# Altium footprint library AMA4B_adapter_board.PcbLib: 84 footprints (part 6 of 6)
Each footprint in its own frame and in the unit in brackets; x right, y up, seen from the top. Pads: shape width x height; smd on the part's side, far side on the other; paste and mask are expansions set on the pad; w line width, h text height; cw(c..) or ccw(c..) is an arc to the next point about the centre after c.
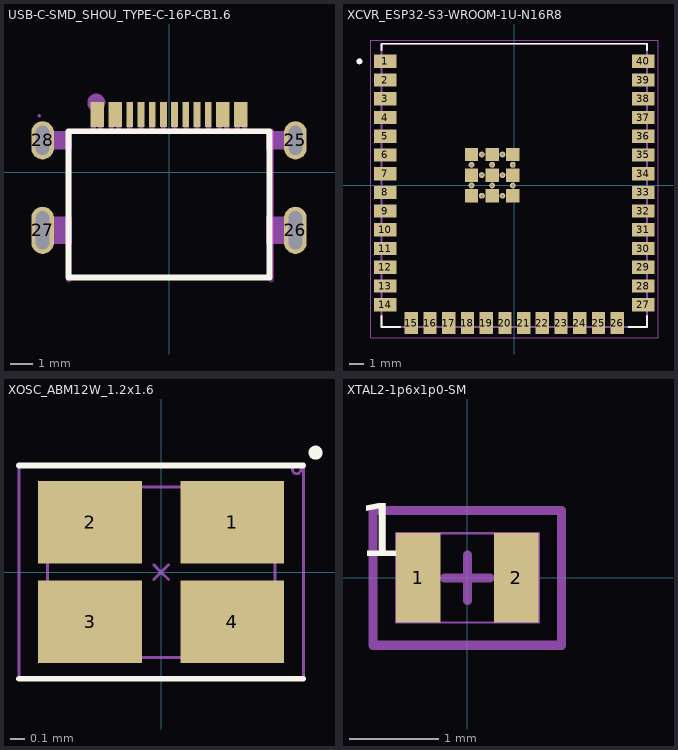
[diagram p5: the footprints below, top view; thin cyan lines are the x and y axes]

## USB-C-SMD_SHOU_TYPE-C-16P-CB1.6 [mm]
pads (20):
  oval 1x1.7 hole 0.6 slot 1.3 at 90 deg paste+0 mask+0.05: 25(5.62,1.425) 28(-5.62,1.425)
  oval 1x2.1 hole 0.6 slot 1.7 at 90 deg paste+0 mask+0.05: 26(5.62,-2.575) 27(-5.62,-2.575)
  rect 0.3x1.1 smd paste-100 mask+0.05: A1(-3.35,2.575) A4(-2.55,2.575) A5(-1.25,2.575) A6(-0.25,2.575) A7(0.25,2.575) A8(1.25,2.575) A9(2.55,2.575) A12(3.35,2.575) B1(3.05,2.575) B4(2.25,2.575) B5(1.75,2.575) B6(0.75,2.575) B7(-0.75,2.575) B8(-1.75,2.575) B9(-2.25,2.575) B12(-3.05,2.575)
Top Overlay:
  lines w0.254: -4.47,-4.675 -4.47,1.825 4.47,1.825 4.47,-4.675 -4.47,-4.675
Top Paste:
  drawing of 16 lines, arcs and shapes, not listed
Keep-Out Layer:
  lines w0.254: -4.451,1.824 4.549,1.824 ; -4.451,1.824 -4.451,-4.776 -4.451,1.824 ; -4.451,1.824 4.549,1.824 ; 4.549,1.824 4.549,-4.776 4.549,1.824 ; 4.549,1.824 4.549,1.824 ; 4.549,1.824 4.549,1.824
Mechanical 6:
  circle w0.4: c-3.232,3.101 r0.2
Top Courtyard:
  region: -5.71,2.524 -5.71,2.549 -5.745,2.584 -5.795,2.584 -5.83,2.549 -5.83,2.524 -5.83,2.499 -5.795,2.464 -5.745,2.464 -5.71,2.499 -5.71,2.524
  region: -3.45,2.524 -3.25,2.524 -3.25,1.724 -3.45,1.724
  region: -3.15,2.524 -2.95,2.524 -2.95,1.724 -3.15,1.724
  region: -2.65,2.524 -2.45,2.524 -2.45,1.724 -2.65,1.724
  region: -2.35,2.524 -2.15,2.524 -2.15,1.724 -2.35,1.724
  region: -1.85,2.524 -1.65,2.524 -1.65,1.724 -1.85,1.724
  region: -1.35,2.524 -1.15,2.524 -1.15,1.724 -1.35,1.724
  region: -0.85,2.524 -0.65,2.524 -0.65,1.724 -0.85,1.724
  region: -0.35,2.524 -0.15,2.524 -0.15,1.724 -0.35,1.724
  region: 0.15,2.524 0.35,2.524 0.35,1.724 0.15,1.724
  region: 0.65,2.524 0.85,2.524 0.85,1.724 0.65,1.724
  region: 1.15,2.524 1.35,2.524 1.35,1.724 1.15,1.724
  region: 1.65,2.524 1.85,2.524 1.85,1.724 1.65,1.724
  region: 2.15,2.524 2.35,2.524 2.35,1.724 2.15,1.724
  region: 2.45,2.524 2.65,2.524 2.65,1.724 2.45,1.724
  region: 2.95,2.524 3.15,2.524 3.15,1.724 2.95,1.724
  region: 3.25,2.524 3.45,2.524 3.45,1.724 3.25,1.724
  region: -5.77,1.825 -5.47,1.825 -5.47,1.025 -5.77,1.025
  region: 5.47,1.825 5.77,1.825 5.77,1.025 5.47,1.025
  region: -5.77,-1.975 -5.47,-1.975 -5.47,-3.175 -5.77,-3.175
  region: 5.47,-1.975 5.77,-1.975 5.77,-3.175 5.47,-3.175
  region: -4.315,1.02 -5.765,1.02 -5.765,1.82 -4.315,1.82
  region: -4.315,-3.17 -5.765,-3.17 -5.765,-1.97 -4.315,-1.97
  region: 5.775,1.02 4.325,1.02 4.325,1.82 5.775,1.82
  region: 5.77,-3.18 4.32,-3.18 4.32,-1.98 5.77,-1.98
  lines w0.051: -4.47,-4.676 -4.47,1.824 4.47,1.824 4.47,-4.676 -4.47,-4.676
3D body "tT7W-USB1.step": height 1.56, standoff -1.6, extent -5.77,-4.675 5.77,2.525

## XCVR_ESP32-S3-WROOM-1U-N16R8 [mm]
height 3.35
pads (61):
  rect 1.5x0.9 smd: 1(-8.75,8.41) 2(-8.75,7.14) 3(-8.75,5.87) 4(-8.75,4.6) 5(-8.75,3.33) 6(-8.75,2.06) 7(-8.75,0.79) 8(-8.75,-0.48) 9(-8.75,-1.75) 10(-8.75,-3.02) 11(-8.75,-4.29) 12(-8.75,-5.56) 13(-8.75,-6.83) 14(-8.75,-8.1) 27(8.75,-8.1) 28(8.75,-6.83) 29(8.75,-5.56) 30(8.75,-4.29) 31(8.75,-3.02) 32(8.75,-1.75) 33(8.75,-0.48) 34(8.75,0.79) 35(8.75,2.06) 36(8.75,3.33) 37(8.75,4.6) 38(8.75,5.87) 39(8.75,7.14) 40(8.75,8.41)
  rect 0.9x1.5 smd: 15(-6.985,-9.35) 16(-5.715,-9.35) 17(-4.445,-9.35) 18(-3.175,-9.35) 19(-1.905,-9.35) 20(-0.635,-9.35) 21(0.635,-9.35) 22(1.905,-9.35) 23(3.175,-9.35) 24(4.445,-9.35) 25(5.715,-9.35) 26(6.985,-9.35)
  rect 0.9x0.9 smd: 41_1(-2.9,2.09) 41_2(-1.5,2.09) 41_3(-0.1,2.09) 41_4(-2.9,0.69) 41_5(-1.5,0.69) 41_6(-0.1,0.69) 41_7(-2.9,-0.71) 41_8(-1.5,-0.71) 41_9(-0.1,-0.71)
  round 0.4 hole 0.2 mask+0: 41_10(-2.2,2.09) 41_11(-0.8,2.09) 41_12(-2.9,1.39) 41_13(-1.5,1.39) 41_14(-0.1,1.39) 41_15(-2.2,0.69) 41_16(-0.8,0.69) 41_17(-2.9,-0.01) 41_18(-1.5,-0.01) 41_19(-0.1,-0.01) 41_20(-2.2,-0.71) 41_21(-0.8,-0.71)
Top Overlay:
  circle w0.2: c-10.5,8.41 r0.1
  lines w0.127: -9,-8.87 -9,-9.6 -7.755,-9.6 ; -9,9.18 -9,9.6 9,9.6 9,9.18 ; 7.755,-9.6 9,-9.6 9,-8.87
Top 3D Body:
  circle w0.2: c-10.5,8.41 r0.1
  lines w0.127: -9,-9.6 -9,9.6 9,9.6 9,-9.6 -9,-9.6
Top Courtyard:
  lines w0.05: -9.75,-10.35 9.75,-10.35 9.75,9.85 -9.75,9.85 -9.75,-10.35
3D body "step_temp.STEP": height 3.35, standoff 0, extent -9,-9.6 9,9.6

## XOSC_ABM12W_1.2x1.6 [mm] "Footprint for the ABM12W series of Xtal oscilators"
height 0.4
pads (4):
  rect 0.73x0.58 smd mask+0.03: 1(0.5,0.35) 2(-0.5,0.35) 3(-0.5,-0.35) 4(0.5,-0.35)
Top Overlay:
  circle w0.05: c1.086,0.841 r0.024
  lines w0.04: -1,-0.75 1,-0.75 ; -1,0.75 1,0.75
Board Shape:
  circle w0.02: c0.953,0.722 r0.029
  lines w0.02: -0.8,-0.6 0.8,-0.6 0.8,0.6 -0.8,0.6 -0.8,-0.6
  text ".Designator" at -0.279,-0.059 h0.5
Top Courtyard:
  lines w0.02: -1,-0.75 1,-0.75 1,0.75 -1,0.75 -1,-0.75
Top Component Center:
  lines w0.02: -0.052,-0.052 0,0 ; -0.052,0.052 0,0 ; 0.052,-0.052 0,0 ; 0.052,0.052 0,0
3D body "ABM12W.STEP": height 0.4, standoff 0, extent -0.8,-0.6 0.8,0.6

## XTAL2-1p6x1p0-SM [mm] "XTAL2-1P6X1P0-SM"
pads (2):
  rect 0.5x1.001 smd: 1(-0.549,0) 2(0.549,0)
Top Overlay:
  text "1" at -1.224,0.049 h1.02
Board Shape:
  lines w0.025: -0.8,-0.5 0.8,-0.5 0.8,0.5 -0.8,0.5 -0.8,-0.5
  text "2" at 0.884,-0.481 h1.02
  text "1" at -1.158,-0.49 h1.02
  text ".Designator" at 0.158,-2.28 h1.02
Top Courtyard:
  lines w0.102: -1.054,-0.754 -1.054,0.754 1.054,0.754 1.054,-0.754 -1.054,-0.754
Top Component Center:
  lines w0.102: -0.254,0 0.254,0 ; 0,-0.254 0,0.254
3D body: height 0.4, standoff 0, extent -0.8,-0.5 0.8,0.5